# Altium footprint library HLib_footprint_Hien.PcbLib: 58 footprints (part 2 of 4)
Each footprint in its own frame and in the unit in brackets; x right, y up, seen from the top. Pads: shape width x height; smd on the part's side, far side on the other; paste and mask are expansions set on the pad; w line width, h text height; cw(c..) or ccw(c..) is an arc to the next point about the centre after c.
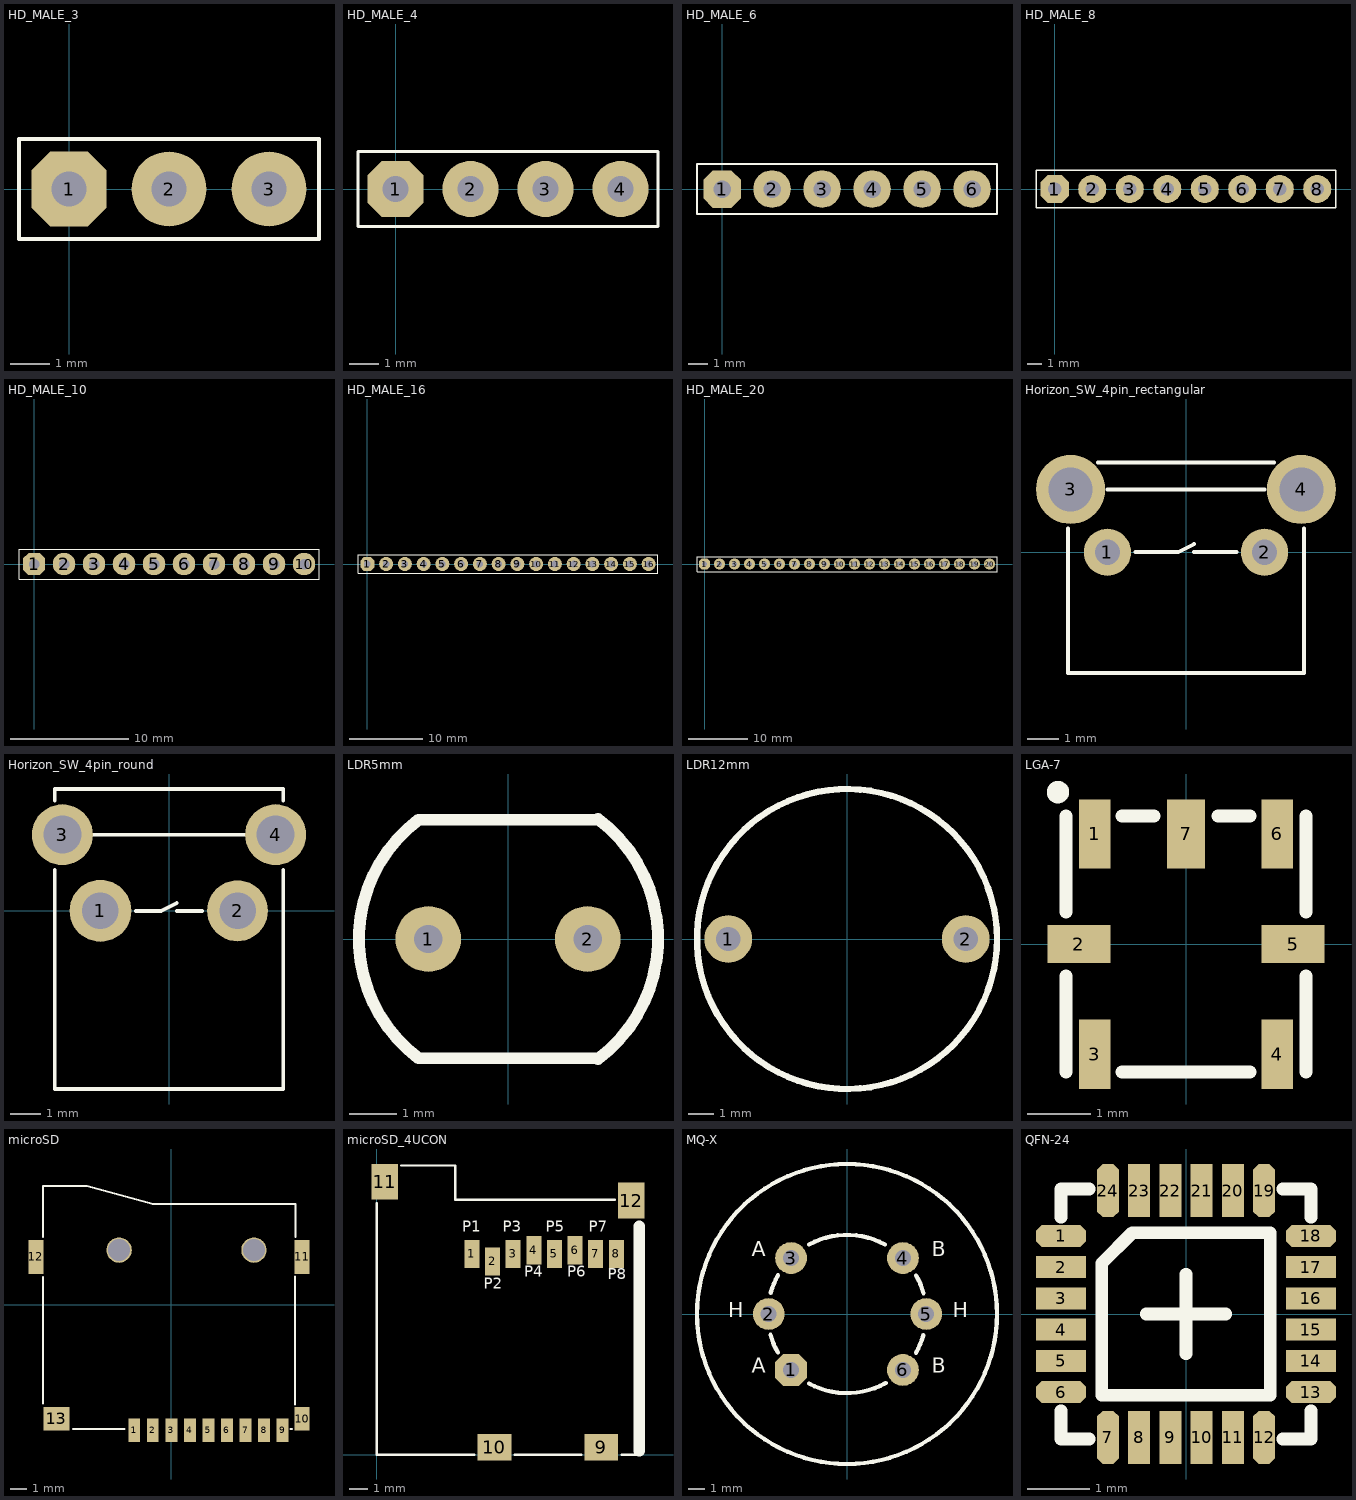
[diagram p1: the footprints below, top view; thin cyan lines are the x and y axes]

## HD_MALE_3 [mil]
pads (3):
  oct 75x75 hole 35: 1(0,0)
  round 75 hole 35: 2(100,0) 3(200,0)
Top Overlay:
  lines w3.94: -50,-50 -50,50 250,50 250,-50 -50,-50
3D body: height 322.83, standoff -118.11, extent -50,-49.73 250,48.64

## HD_MALE_4 [mil]
pads (4):
  oct 75x75 hole 35: 1(0,0)
  round 75 hole 35: 2(100,0) 3(200,0) 4(300,0)
Top Overlay:
  lines w3.94: -50,-50 -50,50 350,50 350,-50 -50,-50
3D body: height 322.83, standoff -118.11, extent -50,-50 350,48.36

## HD_MALE_6 [mil]
pads (6):
  oct 75x75 hole 35: 1(0,0)
  round 75 hole 35: 2(100,0) 3(200,0) 4(300,0) 5(400,0) 6(500,0)
Top Overlay:
  lines w3.94: -50,-50 550,-50 550,50 -50,50 -50,-50
3D body: height 336.22, standoff -118.11, extent -50,-49.01 550,49.02

## HD_MALE_8 [mil]
pads (8):
  oct 75x75 hole 35: 1(0,0)
  round 75 hole 35: 2(100,0) 3(200,0) 4(300,0) 5(400,0) 6(500,0) 7(600,0) 8(700,0)
Top Overlay:
  lines w3.94: -50,-50 750,-50 750,50 -50,50 -50,-50
3D body: height 322.83, standoff -118.11, extent -50,-49.73 750,48.64

## HD_MALE_10 [mil]
pads (10):
  oct 75x75 hole 35: 1(0,0)
  round 75 hole 35: 2(100,0) 3(200,0) 4(300,0) 5(400,0) 6(500,0) 7(600,0) 8(700,0) 9(800,0) 10(900,0)
Top Overlay:
  lines w3.94: -50,-50 -50,50 950,50 950,-50 -50,-50
3D body: height 322.83, standoff -118.11, extent -50,-49.73 950,48.64

## HD_MALE_16 [mil]
pads (16):
  oct 75x75 hole 35: 1(0,0)
  round 75 hole 35: 2(100,0) 3(200,0) 4(300,0) 5(400,0) 6(500,0) 7(600,0) 8(700,0) 9(800,0) 10(900,0) 11(1000,0) 12(1100,0) 13(1200,0) 14(1300,0) 15(1400,0) 16(1500,0)
Top Overlay:
  lines w3.94: -50,-50 1550,-50 1550,50 -50,50 -50,-50
3D body: height 338.58, standoff -118.11, extent -50,-49.73 1550,48.64

## HD_MALE_20 [mil]
pads (20):
  oct 75x75 hole 35: 1(0,0)
  round 75 hole 35: 2(100,0) 3(200,0) 4(300,0) 5(400,0) 6(500,0) 7(600,0) 8(700,0) 9(800,0) 10(900,0) 11(1000,0) 12(1100,0) 13(1200,0) 14(1300,0) 15(1400,0) 16(1500,0) 17(1600,0) 18(1700,0) 19(1800,0) 20(1900,0)
Top Overlay:
  lines w3.94: -50,-50 -50,50 1950,50 1950,-50 -50,-50
3D body: height 322.83, standoff -118.11, extent -50,-50 1950,48.36

## Horizon_SW_4pin_rectangular [mm] "Horizon tact switch 4pin rectangular button"
pads (4):
  round 1.5 hole 0.8: 1(-2.5,0) 2(2.5,0)
  round 2.2 hole 1.4: 3(-3.675,2) 4(3.675,2)
Top Overlay:
  lines w0.127: -3.75,0.762 -3.75,-3.85 3.75,-3.85 3.75,0.762 ; -2.794,2.85 2.794,2.85 ; -2.5,2 2.5,2 ; -1.6,0 -0.254,0 0.254,0.254 ; 0.254,0 1.092,0 1.6,0

## Horizon_SW_4pin_round [mm] "Horizon tact switch 4pin round button"
pads (4):
  round 2.032 hole 1.2: 1(-2.25,0)
  round 2 hole 1.2: 2(2.25,0)
  round 2 hole 1.25: 3(-3.5,2.5) 4(3.5,2.5)
Top Overlay:
  lines w0.127: -3.75,1.337 -3.75,-5.85 3.75,-5.85 3.75,1.337 ; -3.75,3.616 -3.75,4 3.75,4 3.75,3.623 ; -2.5,2.5 2.5,2.5 ; -1.092,0 -0.254,0 0.254,0.254 ; 0.254,0 1.092,0
3D body: height 7.1, standoff -3.5, extent -4.368,-5.461 4.317,4.189

## LDR5mm [mm] "Light Dependent Resistors"
pads (2):
  round 1.4 hole 0.6: 1(-1.7,0) 2(1.7,0)
Top Overlay:
  lines w0.254: 1.902,-2.542 -1.907,-2.542 cw(c0,0) -1.907,2.542 1.902,2.542 ; 1.919,-2.558 ccw(c0,0) 1.919,2.558

## LDR12mm [mm]
pads (2):
  round 1.905 hole 0.965: 1(-4.75,0) 2(4.75,0)
Top Overlay:
  circle w0.254: c0,0 r6

## LGA-7 [mm] "LGA 7pins 3.6x3.8x0.93 (mm)"
pads (7):
  rect 0.5x1.1 smd: 1(-1.45,1.75) 3(-1.45,-1.75) 4(1.45,-1.75) 6(1.45,1.75)
  rect 1x0.6 smd: 2(-1.7,0) 5(1.7,0)
  rect 0.6x1.1 smd: 7(0,1.75)
Top Overlay:
  circle w0.254: c-2.032,2.413 r0.05
  lines w0.203: -1.905,-2.032 -1.905,-0.508 ; -1.905,0.508 -1.905,2.032 ; -1.016,-2.032 1.016,-2.032 ; -1.016,2.032 -0.508,2.032 ; 0.508,2.032 1.016,2.032 ; 1.905,-2.032 1.905,-0.508 ; 1.905,0.508 1.905,2.032
3D body: height 0.98, standoff 0, extent -1.8,-1.9 1.8,1.9

## microSD [mm] "TF uSD"
pads (15):
  rect 0.7x1.4 smd: 1(-2.2,-7.425) 2(-1.1,-7.425) 3(0,-7.425) 4(1.1,-7.425) 5(2.2,-7.425) 6(3.3,-7.425) 7(4.4,-7.425) 8(5.5,-7.425) 9(6.6,-7.425)
  rect 0.88x1.4 smd: 10(7.76,-6.75)
  rect 0.9x2 smd: 11(7.76,2.85) 12(-8.04,2.85)
  rect 1.55x1.4 smd: 13(-6.825,-6.75)
  round 1.5 hole 1.3: ""(-3.1,3.25) ""(4.9,3.25)
Top Overlay:
  lines w0.127: -7.62,-5.842 -7.62,1.651 ; -7.62,4.039 -7.62,7.05 -5,7.05 -1.1,5.994 7.366,5.994 7.366,4.039 ; -5.842,-7.366 -2.794,-7.366 ; 7.087,-7.366 7.163,-7.366 ; 7.341,-5.893 7.341,1.676

## microSD_4UCON [mm]
pads (12):
  rect 0.8x1.5 smd: 1(5.08,10.7) 2(6.18,10.3) 3(7.28,10.7) 4(8.38,10.9) 5(9.48,10.7) 6(10.58,10.9) 7(11.68,10.7) 8(12.78,10.7)
  rect 1.8x1.4 smd: 9(11.98,0.4) 10(6.28,0.4)
  rect 1.4x1.9 smd: 11(0.43,14.55) 12(13.58,13.55)
Top Overlay:
  lines w0.127: 0,13.419 0,0 5.207,0 ; 1.311,15.418 4.2,15.418 4.2,13.602 12.708,13.602 ; 7.366,0 10.922,0 ; 13.058,0 13.9,0
  lines w0.6: 14,0.2 14,12.179
  text "P1" at 4.572,11.684 h1.02
  text "P2" at 5.715,8.636 h1.02
  text "P3" at 6.731,11.684 h1.02
  text "P4" at 7.874,9.271 h1.02
  text "P5" at 9.017,11.684 h1.02
  text "P6" at 10.16,9.271 h1.02
  text "P7" at 11.303,11.684 h1.02
  text "P8" at 12.319,9.144 h1.02
3D body: height 1.85, standoff -0.05, extent -0.064,0 14.187,15.2

## MQ-X [mil]
pads (6):
  oct 75x75 hole 38: 1(-132.23,-132.23)
  round 75 hole 38: 2(-185,0) 3(-132.23,132.23) 4(132.23,132.23) 5(187.01,0) 6(132.23,-132.23)
Top Overlay:
  circle w10: c0,0 r354.33
  lines w10: -180.53,-48.79 ccw(c0,0) -163.25,-91.23 ; -180.19,50.05 cw(c0,0) -162.99,91.68 ; -89.92,163.97 cw(c0,0) 89.92,163.97 ; -89.55,-164.17 ccw(c0,0) 91.68,-162.99 ; 162.99,-91.68 ccw(c0,0) 180.19,-50.05 ; 163.25,91.23 cw(c0,0) 180.53,48.79
  text "H" at -280,-20 h60
  text "H" at 250,-20 h60
  text "B" at 200,-150 h60
  text "B" at 200,125 h60
  text "A" at -225,125 h60
  text "A" at -225,-150 h60

## QFN-24 [mm] "24 Lead QFN (4x4x0.9) mm"
pads (24):
  oct 0.8x0.35 smd: 1(-2,1.25) 6(-2,-1.25) 13(2,-1.25) 18(2,1.25)
  rect 0.8x0.35 smd: 2(-2,0.75) 3(-2,0.25) 4(-2,-0.25) 5(-2,-0.75) 14(2,-0.75) 15(2,-0.25) 16(2,0.25) 17(2,0.75)
  oct 0.35x0.85 smd: 7(-1.25,-1.975) 12(1.25,-1.975) 19(1.25,1.975) 24(-1.25,1.975)
  rect 0.35x0.85 smd: 8(-0.75,-1.975) 9(-0.25,-1.975) 10(0.25,-1.975) 11(0.75,-1.975) 20(0.75,1.975) 21(0.25,1.975) 22(-0.25,1.975) 23(-0.75,1.975)
Top Overlay:
  lines w0.203: -2,-1.55 -2,-2 -1.55,-2 ; -2,1.55 -2,2 -1.55,2 ; -0.635,0 0.635,0 ; 0,-0.635 0,0.635 ; 1.55,-2 2,-2 2,-1.55 ; 1.55,2 2,2 2,1.55 ; -1.35,-1.3 1.35,-1.3 1.35,1.3 -0.859,1.3 -1.35,0.809 -1.35,-1.3
3D body: height 0.9, standoff 0, extent -2.002,-2.002 2.002,2.002